# Altium footprint library Connector_PinHeader_2.54mm.PcbLib: 278 footprints (part 14 of 18) (continued)
## PinHeader_2x20_P2.54mm_Horizontal [mm] (continued)
  text "'.Designator'" at 6.15,-28.177 h1

## PinHeader_2x20_P2.54mm_Vertical [mm]
pads (40):
  rect 1.7x1.7 hole 1: 1(0,0)
  rrect100% 1.7x1.7 hole 1: 2(2.54,0) 3(0,-2.54) 4(2.54,-2.54) 5(0,-5.08) 6(2.54,-5.08) 7(0,-7.62) 8(2.54,-7.62) 9(0,-10.16) 10(2.54,-10.16) 11(0,-12.7) 12(2.54,-12.7) 13(0,-15.24) 14(2.54,-15.24) 15(0,-17.78) 16(2.54,-17.78) 17(0,-20.32) 18(2.54,-20.32) 19(0,-22.86) 20(2.54,-22.86) 21(0,-25.4) 22(2.54,-25.4) 23(0,-27.94) 24(2.54,-27.94) 25(0,-30.48) 26(2.54,-30.48) 27(0,-33.02) 28(2.54,-33.02) 29(0,-35.56) 30(2.54,-35.56) 31(0,-38.1) 32(2.54,-38.1) 33(0,-40.64) 34(2.54,-40.64) 35(0,-43.18) 36(2.54,-43.18) 37(0,-45.72) 38(2.54,-45.72) 39(0,-48.26) 40(2.54,-48.26)
F.SilkS:
  lines w0.254: -1.33,0 -1.33,1.33 0,1.33 ; -1.33,-49.59 -1.33,-1.27 1.27,-1.27 1.27,1.33 3.87,1.33 3.87,-49.59 -1.33,-49.59
F.CrtYd:
  lines w0.254: -1.8,-50.05 -1.8,1.8 4.35,1.8 4.35,-50.05 -1.8,-50.05
F.Fab:
  lines w0.254: -1.27,-49.53 -1.27,0 0,1.27 3.81,1.27 3.81,-49.53 -1.27,-49.53
  text "'.Designator'" at 2.11,-28.177 h1

## PinHeader_2x20_P2.54mm_Vertical_SMD [mm]
pads (40):
  rect 3.15x1 smd: 1(-2.525,24.13) 2(2.525,24.13) 3(-2.525,21.59) 4(2.525,21.59) 5(-2.525,19.05) 6(2.525,19.05) 7(-2.525,16.51) 8(2.525,16.51) 9(-2.525,13.97) 10(2.525,13.97) 11(-2.525,11.43) 12(2.525,11.43) 13(-2.525,8.89) 14(2.525,8.89) 15(-2.525,6.35) 16(2.525,6.35) 17(-2.525,3.81) 18(2.525,3.81) 19(-2.525,1.27) 20(2.525,1.27) 21(-2.525,-1.27) 22(2.525,-1.27) 23(-2.525,-3.81) 24(2.525,-3.81) 25(-2.525,-6.35) 26(2.525,-6.35) 27(-2.525,-8.89) 28(2.525,-8.89) 29(-2.525,-11.43) 30(2.525,-11.43) 31(-2.525,-13.97) 32(2.525,-13.97) 33(-2.525,-16.51) 34(2.525,-16.51) 35(-2.525,-19.05) 36(2.525,-19.05) 37(-2.525,-21.59) 38(2.525,-21.59) 39(-2.525,-24.13) 40(2.525,-24.13)
F.SilkS:
  lines w0.254: -4.04,24.89 -2.6,24.89 -2.6,25.46 2.6,25.46 2.6,24.89 ; -2.6,-24.89 -2.6,-25.46 2.6,-25.46 2.6,-24.89 ; -2.6,-23.37 -2.6,-22.35 ; -2.6,-20.83 -2.6,-19.81 ; -2.6,-18.29 -2.6,-17.27 ; -2.6,-15.75 -2.6,-14.73 ; -2.6,-13.21 -2.6,-12.19 ; -2.6,-10.67 -2.6,-9.65 ; -2.6,-8.13 -2.6,-7.11 ; -2.6,-5.59 -2.6,-4.57 ; -2.6,-3.05 -2.6,-2.03 ; -2.6,-0.51 -2.6,0.51 ; -2.6,2.03 -2.6,3.05 ; -2.6,4.57 -2.6,5.59 ; -2.6,7.11 -2.6,8.13 ; -2.6,9.65 -2.6,10.67 ; -2.6,12.19 -2.6,13.21 ; -2.6,14.73 -2.6,15.75 ; -2.6,17.27 -2.6,18.29 ; -2.6,19.81 -2.6,20.83 ; -2.6,22.35 -2.6,23.37 ; 2.6,-23.37 2.6,-22.35 ; 2.6,-20.83 2.6,-19.81 ; 2.6,-18.29 2.6,-17.27 ; 2.6,-15.75 2.6,-14.73 ; 2.6,-13.21 2.6,-12.19 ; 2.6,-10.67 2.6,-9.65 ; 2.6,-8.13 2.6,-7.11 ; 2.6,-5.59 2.6,-4.57 ; 2.6,-3.05 2.6,-2.03 ; 2.6,-0.51 2.6,0.51 ; 2.6,2.03 2.6,3.05 ; 2.6,4.57 2.6,5.59 ; 2.6,7.11 2.6,8.13 ; 2.6,9.65 2.6,10.67 ; 2.6,12.19 2.6,13.21 ; 2.6,14.73 2.6,15.75 ; 2.6,17.27 2.6,18.29 ; 2.6,19.81 2.6,20.83 ; 2.6,22.35 2.6,23.37
F.CrtYd:
  lines w0.254: -5.9,-25.9 -5.9,25.9 5.9,25.9 5.9,-25.9 -5.9,-25.9
F.Fab:
  lines w0.254: -2.54,-24.45 -3.6,-24.45 -3.6,-23.81 -2.54,-23.81 ; -2.54,-21.91 -3.6,-21.91 -3.6,-21.27 -2.54,-21.27 ; -2.54,-19.37 -3.6,-19.37 -3.6,-18.73 -2.54,-18.73 ; -2.54,-16.83 -3.6,-16.83 -3.6,-16.19 -2.54,-16.19 ; -2.54,-14.29 -3.6,-14.29 -3.6,-13.65 -2.54,-13.65 ; -2.54,-11.75 -3.6,-11.75 -3.6,-11.11 -2.54,-11.11 ; -2.54,-9.21 -3.6,-9.21 -3.6,-8.57 -2.54,-8.57 ; -2.54,-6.67 -3.6,-6.67 -3.6,-6.03 -2.54,-6.03 ; -2.54,-4.13 -3.6,-4.13 -3.6,-3.49 -2.54,-3.49 ; -2.54,-1.59 -3.6,-1.59 -3.6,-0.95 -2.54,-0.95 ; -2.54,0.95 -3.6,0.95 -3.6,1.59 -2.54,1.59 ; -2.54,3.49 -3.6,3.49 -3.6,4.13 -2.54,4.13 ; -2.54,6.03 -3.6,6.03 -3.6,6.67 -2.54,6.67 ; -2.54,8.57 -3.6,8.57 -3.6,9.21 -2.54,9.21 ; -2.54,11.11 -3.6,11.11 -3.6,11.75 -2.54,11.75 ; -2.54,13.65 -3.6,13.65 -3.6,14.29 -2.54,14.29 ; -2.54,16.19 -3.6,16.19 -3.6,16.83 -2.54,16.83 ; -2.54,18.73 -3.6,18.73 -3.6,19.37 -2.54,19.37 ; -2.54,21.27 -3.6,21.27 -3.6,21.91 -2.54,21.91 ; -2.54,23.81 -3.6,23.81 -3.6,24.45 -2.54,24.45 ; 2.54,-24.45 3.6,-24.45 3.6,-23.81 2.54,-23.81 ; 2.54,-21.91 3.6,-21.91 3.6,-21.27 2.54,-21.27 ; 2.54,-19.37 3.6,-19.37 3.6,-18.73 2.54,-18.73 ; 2.54,-16.83 3.6,-16.83 3.6,-16.19 2.54,-16.19 ; 2.54,-14.29 3.6,-14.29 3.6,-13.65 2.54,-13.65 ; 2.54,-11.75 3.6,-11.75 3.6,-11.11 2.54,-11.11 ; 2.54,-9.21 3.6,-9.21 3.6,-8.57 2.54,-8.57 ; 2.54,-6.67 3.6,-6.67 3.6,-6.03 2.54,-6.03 ; 2.54,-4.13 3.6,-4.13 3.6,-3.49 2.54,-3.49 ; 2.54,-1.59 3.6,-1.59 3.6,-0.95 2.54,-0.95 ; 2.54,0.95 3.6,0.95 3.6,1.59 2.54,1.59 ; 2.54,3.49 3.6,3.49 3.6,4.13 2.54,4.13 ; 2.54,6.03 3.6,6.03 3.6,6.67 2.54,6.67 ; 2.54,8.57 3.6,8.57 3.6,9.21 2.54,9.21 ; 2.54,11.11 3.6,11.11 3.6,11.75 2.54,11.75 ; 2.54,13.65 3.6,13.65 3.6,14.29 2.54,14.29 ; 2.54,16.19 3.6,16.19 3.6,16.83 2.54,16.83 ; 2.54,18.73 3.6,18.73 3.6,19.37 2.54,19.37 ; 2.54,21.27 3.6,21.27 3.6,21.91 2.54,21.91 ; 2.54,23.81 3.6,23.81 3.6,24.45 2.54,24.45 ; -2.54,24.45 -1.59,25.4 2.54,25.4 2.54,-25.4 -2.54,-25.4 -2.54,24.45
  text "'.Designator'" at 0.84,-4.047 h1

## PinHeader_2x21_P2.54mm_Horizontal [mm]
pads (42):
  rect 1.7x1.7 hole 1: 1(0,0)
  rrect100% 1.7x1.7 hole 1: 2(2.54,0) 3(0,-2.54) 4(2.54,-2.54) 5(0,-5.08) 6(2.54,-5.08) 7(0,-7.62) 8(2.54,-7.62) 9(0,-10.16) 10(2.54,-10.16) 11(0,-12.7) 12(2.54,-12.7) 13(0,-15.24) 14(2.54,-15.24) 15(0,-17.78) 16(2.54,-17.78) 17(0,-20.32) 18(2.54,-20.32) 19(0,-22.86) 20(2.54,-22.86) 21(0,-25.4) 22(2.54,-25.4) 23(0,-27.94) 24(2.54,-27.94) 25(0,-30.48) 26(2.54,-30.48) 27(0,-33.02) 28(2.54,-33.02) 29(0,-35.56) 30(2.54,-35.56) 31(0,-38.1) 32(2.54,-38.1) 33(0,-40.64) 34(2.54,-40.64) 35(0,-43.18) 36(2.54,-43.18) 37(0,-45.72) 38(2.54,-45.72) 39(0,-48.26) 40(2.54,-48.26) 41(0,-50.8) 42(2.54,-50.8)
F.SilkS:
  drawing of 179 lines, arcs and shapes, not listed
F.CrtYd:
  lines w0.254: -1.8,-52.6 -1.8,1.8 13.1,1.8 13.1,-52.6 -1.8,-52.6
F.Fab:
  lines w0.254: 4.04,-51.12 -0.32,-51.12 -0.32,-50.48 4.04,-50.48 ; 4.04,-48.58 -0.32,-48.58 -0.32,-47.94 4.04,-47.94 ; 4.04,-46.04 -0.32,-46.04 -0.32,-45.4 4.04,-45.4 ; 4.04,-43.5 -0.32,-43.5 -0.32,-42.86 4.04,-42.86 ; 4.04,-40.96 -0.32,-40.96 -0.32,-40.32 4.04,-40.32 ; 4.04,-38.42 -0.32,-38.42 -0.32,-37.78 4.04,-37.78 ; 4.04,-35.88 -0.32,-35.88 -0.32,-35.24 4.04,-35.24 ; 4.04,-33.34 -0.32,-33.34 -0.32,-32.7 4.04,-32.7 ; 4.04,-30.8 -0.32,-30.8 -0.32,-30.16 4.04,-30.16 ; 4.04,-28.26 -0.32,-28.26 -0.32,-27.62 4.04,-27.62 ; 4.04,-25.72 -0.32,-25.72 -0.32,-25.08 4.04,-25.08 ; 4.04,-23.18 -0.32,-23.18 -0.32,-22.54 4.04,-22.54 ; 4.04,-20.64 -0.32,-20.64 -0.32,-20 4.04,-20 ; 4.04,-18.1 -0.32,-18.1 -0.32,-17.46 4.04,-17.46 ; 4.04,-15.56 -0.32,-15.56 -0.32,-14.92 4.04,-14.92 ; 4.04,-13.02 -0.32,-13.02 -0.32,-12.38 4.04,-12.38 ; 4.04,-10.48 -0.32,-10.48 -0.32,-9.84 4.04,-9.84 ; 4.04,-7.94 -0.32,-7.94 -0.32,-7.3 4.04,-7.3 ; 4.04,-5.4 -0.32,-5.4 -0.32,-4.76 4.04,-4.76 ; 4.04,-2.86 -0.32,-2.86 -0.32,-2.22 4.04,-2.22 ; 4.04,-0.32 -0.32,-0.32 -0.32,0.32 4.04,0.32 ; 6.58,-51.12 12.58,-51.12 12.58,-50.48 6.58,-50.48 ; 6.58,-48.58 12.58,-48.58 12.58,-47.94 6.58,-47.94 ; 6.58,-46.04 12.58,-46.04 12.58,-45.4 6.58,-45.4 ; 6.58,-43.5 12.58,-43.5 12.58,-42.86 6.58,-42.86 ; 6.58,-40.96 12.58,-40.96 12.58,-40.32 6.58,-40.32 ; 6.58,-38.42 12.58,-38.42 12.58,-37.78 6.58,-37.78 ; 6.58,-35.88 12.58,-35.88 12.58,-35.24 6.58,-35.24 ; 6.58,-33.34 12.58,-33.34 12.58,-32.7 6.58,-32.7 ; 6.58,-30.8 12.58,-30.8 12.58,-30.16 6.58,-30.16 ; 6.58,-28.26 12.58,-28.26 12.58,-27.62 6.58,-27.62 ; 6.58,-25.72 12.58,-25.72 12.58,-25.08 6.58,-25.08 ; 6.58,-23.18 12.58,-23.18 12.58,-22.54 6.58,-22.54 ; 6.58,-20.64 12.58,-20.64 12.58,-20 6.58,-20 ; 6.58,-18.1 12.58,-18.1 12.58,-17.46 6.58,-17.46 ; 6.58,-15.56 12.58,-15.56 12.58,-14.92 6.58,-14.92 ; 6.58,-13.02 12.58,-13.02 12.58,-12.38 6.58,-12.38 ; 6.58,-10.48 12.58,-10.48 12.58,-9.84 6.58,-9.84 ; 6.58,-7.94 12.58,-7.94 12.58,-7.3 6.58,-7.3 ; 6.58,-5.4 12.58,-5.4 12.58,-4.76 6.58,-4.76 ; 6.58,-2.86 12.58,-2.86 12.58,-2.22 6.58,-2.22 ; 6.58,-0.32 12.58,-0.32 12.58,0.32 6.58,0.32 ; 4.04,-52.07 4.04,0.635 4.675,1.27 6.58,1.27 6.58,-52.07 4.04,-52.07
  text "'.Designator'" at 6.15,-29.447 h1

## PinHeader_2x21_P2.54mm_Vertical [mm]
pads (42):
  rect 1.7x1.7 hole 1: 1(0,0)
  rrect100% 1.7x1.7 hole 1: 2(2.54,0) 3(0,-2.54) 4(2.54,-2.54) 5(0,-5.08) 6(2.54,-5.08) 7(0,-7.62) 8(2.54,-7.62) 9(0,-10.16) 10(2.54,-10.16) 11(0,-12.7) 12(2.54,-12.7) 13(0,-15.24) 14(2.54,-15.24) 15(0,-17.78) 16(2.54,-17.78) 17(0,-20.32) 18(2.54,-20.32) 19(0,-22.86) 20(2.54,-22.86) 21(0,-25.4) 22(2.54,-25.4) 23(0,-27.94) 24(2.54,-27.94) 25(0,-30.48) 26(2.54,-30.48) 27(0,-33.02) 28(2.54,-33.02) 29(0,-35.56) 30(2.54,-35.56) 31(0,-38.1) 32(2.54,-38.1) 33(0,-40.64) 34(2.54,-40.64) 35(0,-43.18) 36(2.54,-43.18) 37(0,-45.72) 38(2.54,-45.72) 39(0,-48.26) 40(2.54,-48.26) 41(0,-50.8) 42(2.54,-50.8)
F.SilkS:
  lines w0.254: -1.33,0 -1.33,1.33 0,1.33 ; -1.33,-52.13 -1.33,-1.27 1.27,-1.27 1.27,1.33 3.87,1.33 3.87,-52.13 -1.33,-52.13
F.CrtYd:
  lines w0.254: -1.8,-52.6 -1.8,1.8 4.35,1.8 4.35,-52.6 -1.8,-52.6
F.Fab:
  lines w0.254: -1.27,-52.07 -1.27,0 0,1.27 3.81,1.27 3.81,-52.07 -1.27,-52.07
  text "'.Designator'" at 2.11,-29.447 h1

## PinHeader_2x21_P2.54mm_Vertical_SMD [mm]
pads (42):
  rect 3.15x1 smd: 1(-2.525,25.4) 2(2.525,25.4) 3(-2.525,22.86) 4(2.525,22.86) 5(-2.525,20.32) 6(2.525,20.32) 7(-2.525,17.78) 8(2.525,17.78) 9(-2.525,15.24) 10(2.525,15.24) 11(-2.525,12.7) 12(2.525,12.7) 13(-2.525,10.16) 14(2.525,10.16) 15(-2.525,7.62) 16(2.525,7.62) 17(-2.525,5.08) 18(2.525,5.08) 19(-2.525,2.54) 20(2.525,2.54) 21(-2.525,0) 22(2.525,0) 23(-2.525,-2.54) 24(2.525,-2.54) 25(-2.525,-5.08) 26(2.525,-5.08) 27(-2.525,-7.62) 28(2.525,-7.62) 29(-2.525,-10.16) 30(2.525,-10.16) 31(-2.525,-12.7) 32(2.525,-12.7) 33(-2.525,-15.24) 34(2.525,-15.24) 35(-2.525,-17.78) 36(2.525,-17.78) 37(-2.525,-20.32) 38(2.525,-20.32) 39(-2.525,-22.86) 40(2.525,-22.86) 41(-2.525,-25.4) 42(2.525,-25.4)
F.SilkS:
  lines w0.254: -4.04,26.16 -2.6,26.16 -2.6,26.73 2.6,26.73 2.6,26.16 ; -2.6,-26.16 -2.6,-26.73 2.6,-26.73 2.6,-26.16 ; -2.6,-24.64 -2.6,-23.62 ; -2.6,-22.1 -2.6,-21.08 ; -2.6,-19.56 -2.6,-18.54 ; -2.6,-17.02 -2.6,-16 ; -2.6,-14.48 -2.6,-13.46 ; -2.6,-11.94 -2.6,-10.92 ; -2.6,-9.4 -2.6,-8.38 ; -2.6,-6.86 -2.6,-5.84 ; -2.6,-4.32 -2.6,-3.3 ; -2.6,-1.78 -2.6,-0.76 ; -2.6,0.76 -2.6,1.78 ; -2.6,3.3 -2.6,4.32 ; -2.6,5.84 -2.6,6.86 ; -2.6,8.38 -2.6,9.4 ; -2.6,10.92 -2.6,11.94 ; -2.6,13.46 -2.6,14.48 ; -2.6,16 -2.6,17.02 ; -2.6,18.54 -2.6,19.56 ; -2.6,21.08 -2.6,22.1 ; -2.6,23.62 -2.6,24.64 ; 2.6,-24.64 2.6,-23.62 ; 2.6,-22.1 2.6,-21.08 ; 2.6,-19.56 2.6,-18.54 ; 2.6,-17.02 2.6,-16 ; 2.6,-14.48 2.6,-13.46 ; 2.6,-11.94 2.6,-10.92 ; 2.6,-9.4 2.6,-8.38 ; 2.6,-6.86 2.6,-5.84 ; 2.6,-4.32 2.6,-3.3 ; 2.6,-1.78 2.6,-0.76 ; 2.6,0.76 2.6,1.78 ; 2.6,3.3 2.6,4.32 ; 2.6,5.84 2.6,6.86 ; 2.6,8.38 2.6,9.4 ; 2.6,10.92 2.6,11.94 ; 2.6,13.46 2.6,14.48 ; 2.6,16 2.6,17.02 ; 2.6,18.54 2.6,19.56 ; 2.6,21.08 2.6,22.1 ; 2.6,23.62 2.6,24.64
F.CrtYd:
  lines w0.254: -5.9,-27.2 -5.9,27.2 5.9,27.2 5.9,-27.2 -5.9,-27.2
F.Fab:
  lines w0.254: -2.54,-25.72 -3.6,-25.72 -3.6,-25.08 -2.54,-25.08 ; -2.54,-23.18 -3.6,-23.18 -3.6,-22.54 -2.54,-22.54 ; -2.54,-20.64 -3.6,-20.64 -3.6,-20 -2.54,-20 ; -2.54,-18.1 -3.6,-18.1 -3.6,-17.46 -2.54,-17.46 ; -2.54,-15.56 -3.6,-15.56 -3.6,-14.92 -2.54,-14.92 ; -2.54,-13.02 -3.6,-13.02 -3.6,-12.38 -2.54,-12.38 ; -2.54,-10.48 -3.6,-10.48 -3.6,-9.84 -2.54,-9.84 ; -2.54,-7.94 -3.6,-7.94 -3.6,-7.3 -2.54,-7.3 ; -2.54,-5.4 -3.6,-5.4 -3.6,-4.76 -2.54,-4.76 ; -2.54,-2.86 -3.6,-2.86 -3.6,-2.22 -2.54,-2.22 ; -2.54,-0.32 -3.6,-0.32 -3.6,0.32 -2.54,0.32 ; -2.54,2.22 -3.6,2.22 -3.6,2.86 -2.54,2.86 ; -2.54,4.76 -3.6,4.76 -3.6,5.4 -2.54,5.4 ; -2.54,7.3 -3.6,7.3 -3.6,7.94 -2.54,7.94 ; -2.54,9.84 -3.6,9.84 -3.6,10.48 -2.54,10.48 ; -2.54,12.38 -3.6,12.38 -3.6,13.02 -2.54,13.02 ; -2.54,14.92 -3.6,14.92 -3.6,15.56 -2.54,15.56 ; -2.54,17.46 -3.6,17.46 -3.6,18.1 -2.54,18.1 ; -2.54,20 -3.6,20 -3.6,20.64 -2.54,20.64 ; -2.54,22.54 -3.6,22.54 -3.6,23.18 -2.54,23.18 ; -2.54,25.08 -3.6,25.08 -3.6,25.72 -2.54,25.72 ; 2.54,-25.72 3.6,-25.72 3.6,-25.08 2.54,-25.08 ; 2.54,-23.18 3.6,-23.18 3.6,-22.54 2.54,-22.54 ; 2.54,-20.64 3.6,-20.64 3.6,-20 2.54,-20 ; 2.54,-18.1 3.6,-18.1 3.6,-17.46 2.54,-17.46 ; 2.54,-15.56 3.6,-15.56 3.6,-14.92 2.54,-14.92 ; 2.54,-13.02 3.6,-13.02 3.6,-12.38 2.54,-12.38 ; 2.54,-10.48 3.6,-10.48 3.6,-9.84 2.54,-9.84 ; 2.54,-7.94 3.6,-7.94 3.6,-7.3 2.54,-7.3 ; 2.54,-5.4 3.6,-5.4 3.6,-4.76 2.54,-4.76 ; 2.54,-2.86 3.6,-2.86 3.6,-2.22 2.54,-2.22 ; 2.54,-0.32 3.6,-0.32 3.6,0.32 2.54,0.32 ; 2.54,2.22 3.6,2.22 3.6,2.86 2.54,2.86 ; 2.54,4.76 3.6,4.76 3.6,5.4 2.54,5.4 ; 2.54,7.3 3.6,7.3 3.6,7.94 2.54,7.94 ; 2.54,9.84 3.6,9.84 3.6,10.48 2.54,10.48 ; 2.54,12.38 3.6,12.38 3.6,13.02 2.54,13.02 ; 2.54,14.92 3.6,14.92 3.6,15.56 2.54,15.56 ; 2.54,17.46 3.6,17.46 3.6,18.1 2.54,18.1 ; 2.54,20 3.6,20 3.6,20.64 2.54,20.64 ; 2.54,22.54 3.6,22.54 3.6,23.18 2.54,23.18 ; 2.54,25.08 3.6,25.08 3.6,25.72 2.54,25.72 ; -2.54,25.72 -1.59,26.67 2.54,26.67 2.54,-26.67 -2.54,-26.67 -2.54,25.72
  text "'.Designator'" at 0.84,-4.047 h1

## PinHeader_2x22_P2.54mm_Horizontal [mm]
pads (44):
  rect 1.7x1.7 hole 1: 1(0,0)
  rrect100% 1.7x1.7 hole 1: 2(2.54,0) 3(0,-2.54) 4(2.54,-2.54) 5(0,-5.08) 6(2.54,-5.08) 7(0,-7.62) 8(2.54,-7.62) 9(0,-10.16) 10(2.54,-10.16) 11(0,-12.7) 12(2.54,-12.7) 13(0,-15.24) 14(2.54,-15.24) 15(0,-17.78) 16(2.54,-17.78) 17(0,-20.32) 18(2.54,-20.32) 19(0,-22.86) 20(2.54,-22.86) 21(0,-25.4) 22(2.54,-25.4) 23(0,-27.94) 24(2.54,-27.94) 25(0,-30.48) 26(2.54,-30.48) 27(0,-33.02) 28(2.54,-33.02) 29(0,-35.56) 30(2.54,-35.56) 31(0,-38.1) 32(2.54,-38.1) 33(0,-40.64) 34(2.54,-40.64) 35(0,-43.18) 36(2.54,-43.18) 37(0,-45.72) 38(2.54,-45.72) 39(0,-48.26) 40(2.54,-48.26) 41(0,-50.8) 42(2.54,-50.8) 43(0,-53.34) 44(2.54,-53.34)
F.SilkS:
  drawing of 187 lines, arcs and shapes, not listed
F.CrtYd:
  lines w0.254: -1.8,-55.15 -1.8,1.8 13.1,1.8 13.1,-55.15 -1.8,-55.15
F.Fab:
  lines w0.254: 4.04,-53.66 -0.32,-53.66 -0.32,-53.02 4.04,-53.02 ; 4.04,-51.12 -0.32,-51.12 -0.32,-50.48 4.04,-50.48 ; 4.04,-48.58 -0.32,-48.58 -0.32,-47.94 4.04,-47.94 ; 4.04,-46.04 -0.32,-46.04 -0.32,-45.4 4.04,-45.4 ; 4.04,-43.5 -0.32,-43.5 -0.32,-42.86 4.04,-42.86 ; 4.04,-40.96 -0.32,-40.96 -0.32,-40.32 4.04,-40.32 ; 4.04,-38.42 -0.32,-38.42 -0.32,-37.78 4.04,-37.78 ; 4.04,-35.88 -0.32,-35.88 -0.32,-35.24 4.04,-35.24 ; 4.04,-33.34 -0.32,-33.34 -0.32,-32.7 4.04,-32.7 ; 4.04,-30.8 -0.32,-30.8 -0.32,-30.16 4.04,-30.16 ; 4.04,-28.26 -0.32,-28.26 -0.32,-27.62 4.04,-27.62 ; 4.04,-25.72 -0.32,-25.72 -0.32,-25.08 4.04,-25.08 ; 4.04,-23.18 -0.32,-23.18 -0.32,-22.54 4.04,-22.54 ; 4.04,-20.64 -0.32,-20.64 -0.32,-20 4.04,-20 ; 4.04,-18.1 -0.32,-18.1 -0.32,-17.46 4.04,-17.46 ; 4.04,-15.56 -0.32,-15.56 -0.32,-14.92 4.04,-14.92 ; 4.04,-13.02 -0.32,-13.02 -0.32,-12.38 4.04,-12.38 ; 4.04,-10.48 -0.32,-10.48 -0.32,-9.84 4.04,-9.84 ; 4.04,-7.94 -0.32,-7.94 -0.32,-7.3 4.04,-7.3 ; 4.04,-5.4 -0.32,-5.4 -0.32,-4.76 4.04,-4.76 ; 4.04,-2.86 -0.32,-2.86 -0.32,-2.22 4.04,-2.22 ; 4.04,-0.32 -0.32,-0.32 -0.32,0.32 4.04,0.32 ; 6.58,-53.66 12.58,-53.66 12.58,-53.02 6.58,-53.02 ; 6.58,-51.12 12.58,-51.12 12.58,-50.48 6.58,-50.48 ; 6.58,-48.58 12.58,-48.58 12.58,-47.94 6.58,-47.94 ; 6.58,-46.04 12.58,-46.04 12.58,-45.4 6.58,-45.4 ; 6.58,-43.5 12.58,-43.5 12.58,-42.86 6.58,-42.86 ; 6.58,-40.96 12.58,-40.96 12.58,-40.32 6.58,-40.32 ; 6.58,-38.42 12.58,-38.42 12.58,-37.78 6.58,-37.78 ; 6.58,-35.88 12.58,-35.88 12.58,-35.24 6.58,-35.24 ; 6.58,-33.34 12.58,-33.34 12.58,-32.7 6.58,-32.7 ; 6.58,-30.8 12.58,-30.8 12.58,-30.16 6.58,-30.16 ; 6.58,-28.26 12.58,-28.26 12.58,-27.62 6.58,-27.62 ; 6.58,-25.72 12.58,-25.72 12.58,-25.08 6.58,-25.08 ; 6.58,-23.18 12.58,-23.18 12.58,-22.54 6.58,-22.54 ; 6.58,-20.64 12.58,-20.64 12.58,-20 6.58,-20 ; 6.58,-18.1 12.58,-18.1 12.58,-17.46 6.58,-17.46 ; 6.58,-15.56 12.58,-15.56 12.58,-14.92 6.58,-14.92 ; 6.58,-13.02 12.58,-13.02 12.58,-12.38 6.58,-12.38 ; 6.58,-10.48 12.58,-10.48 12.58,-9.84 6.58,-9.84 ; 6.58,-7.94 12.58,-7.94 12.58,-7.3 6.58,-7.3 ; 6.58,-5.4 12.58,-5.4 12.58,-4.76 6.58,-4.76 ; 6.58,-2.86 12.58,-2.86 12.58,-2.22 6.58,-2.22 ; 6.58,-0.32 12.58,-0.32 12.58,0.32 6.58,0.32 ; 4.04,-54.61 4.04,0.635 4.675,1.27 6.58,1.27 6.58,-54.61 4.04,-54.61
  text "'.Designator'" at 6.15,-30.717 h1

## PinHeader_2x22_P2.54mm_Vertical [mm]
pads (44):
  rect 1.7x1.7 hole 1: 1(0,0)
  rrect100% 1.7x1.7 hole 1: 2(2.54,0) 3(0,-2.54) 4(2.54,-2.54) 5(0,-5.08) 6(2.54,-5.08) 7(0,-7.62) 8(2.54,-7.62) 9(0,-10.16) 10(2.54,-10.16) 11(0,-12.7) 12(2.54,-12.7) 13(0,-15.24) 14(2.54,-15.24) 15(0,-17.78) 16(2.54,-17.78) 17(0,-20.32) 18(2.54,-20.32) 19(0,-22.86) 20(2.54,-22.86) 21(0,-25.4) 22(2.54,-25.4) 23(0,-27.94) 24(2.54,-27.94) 25(0,-30.48) 26(2.54,-30.48) 27(0,-33.02) 28(2.54,-33.02) 29(0,-35.56) 30(2.54,-35.56) 31(0,-38.1) 32(2.54,-38.1) 33(0,-40.64) 34(2.54,-40.64) 35(0,-43.18) 36(2.54,-43.18) 37(0,-45.72) 38(2.54,-45.72) 39(0,-48.26) 40(2.54,-48.26) 41(0,-50.8) 42(2.54,-50.8) 43(0,-53.34) 44(2.54,-53.34)
F.SilkS:
  lines w0.254: -1.33,0 -1.33,1.33 0,1.33 ; -1.33,-54.67 -1.33,-1.27 1.27,-1.27 1.27,1.33 3.87,1.33 3.87,-54.67 -1.33,-54.67
F.CrtYd:
  lines w0.254: -1.8,-55.15 -1.8,1.8 4.35,1.8 4.35,-55.15 -1.8,-55.15
F.Fab:
  lines w0.254: -1.27,-54.61 -1.27,0 0,1.27 3.81,1.27 3.81,-54.61 -1.27,-54.61
  text "'.Designator'" at 2.11,-30.717 h1

## PinHeader_2x22_P2.54mm_Vertical_SMD [mm]
pads (44):
  rect 3.15x1 smd: 1(-2.525,26.67) 2(2.525,26.67) 3(-2.525,24.13) 4(2.525,24.13) 5(-2.525,21.59) 6(2.525,21.59) 7(-2.525,19.05) 8(2.525,19.05) 9(-2.525,16.51) 10(2.525,16.51) 11(-2.525,13.97) 12(2.525,13.97) 13(-2.525,11.43) 14(2.525,11.43) 15(-2.525,8.89) 16(2.525,8.89) 17(-2.525,6.35) 18(2.525,6.35) 19(-2.525,3.81) 20(2.525,3.81) 21(-2.525,1.27) 22(2.525,1.27) 23(-2.525,-1.27) 24(2.525,-1.27) 25(-2.525,-3.81) 26(2.525,-3.81) 27(-2.525,-6.35) 28(2.525,-6.35) 29(-2.525,-8.89) 30(2.525,-8.89) 31(-2.525,-11.43) 32(2.525,-11.43) 33(-2.525,-13.97) 34(2.525,-13.97) 35(-2.525,-16.51) 36(2.525,-16.51) 37(-2.525,-19.05) 38(2.525,-19.05) 39(-2.525,-21.59) 40(2.525,-21.59) 41(-2.525,-24.13) 42(2.525,-24.13) 43(-2.525,-26.67) 44(2.525,-26.67)
F.SilkS:
  lines w0.254: -4.04,27.43 -2.6,27.43 -2.6,28 2.6,28 2.6,27.43 ; -2.6,-27.43 -2.6,-28 2.6,-28 2.6,-27.43 ; -2.6,-25.91 -2.6,-24.89 ; -2.6,-23.37 -2.6,-22.35 ; -2.6,-20.83 -2.6,-19.81 ; -2.6,-18.29 -2.6,-17.27 ; -2.6,-15.75 -2.6,-14.73 ; -2.6,-13.21 -2.6,-12.19 ; -2.6,-10.67 -2.6,-9.65 ; -2.6,-8.13 -2.6,-7.11 ; -2.6,-5.59 -2.6,-4.57 ; -2.6,-3.05 -2.6,-2.03 ; -2.6,-0.51 -2.6,0.51 ; -2.6,2.03 -2.6,3.05 ; -2.6,4.57 -2.6,5.59 ; -2.6,7.11 -2.6,8.13 ; -2.6,9.65 -2.6,10.67 ; -2.6,12.19 -2.6,13.21 ; -2.6,14.73 -2.6,15.75 ; -2.6,17.27 -2.6,18.29 ; -2.6,19.81 -2.6,20.83 ; -2.6,22.35 -2.6,23.37 ; -2.6,24.89 -2.6,25.91 ; 2.6,-25.91 2.6,-24.89 ; 2.6,-23.37 2.6,-22.35 ; 2.6,-20.83 2.6,-19.81 ; 2.6,-18.29 2.6,-17.27 ; 2.6,-15.75 2.6,-14.73 ; 2.6,-13.21 2.6,-12.19 ; 2.6,-10.67 2.6,-9.65 ; 2.6,-8.13 2.6,-7.11 ; 2.6,-5.59 2.6,-4.57 ; 2.6,-3.05 2.6,-2.03 ; 2.6,-0.51 2.6,0.51 ; 2.6,2.03 2.6,3.05 ; 2.6,4.57 2.6,5.59 ; 2.6,7.11 2.6,8.13 ; 2.6,9.65 2.6,10.67 ; 2.6,12.19 2.6,13.21 ; 2.6,14.73 2.6,15.75 ; 2.6,17.27 2.6,18.29 ; 2.6,19.81 2.6,20.83 ; 2.6,22.35 2.6,23.37 ; 2.6,24.89 2.6,25.91
F.CrtYd:
  lines w0.254: -5.9,-28.45 -5.9,28.45 5.9,28.45 5.9,-28.45 -5.9,-28.45
F.Fab:
  lines w0.254: -2.54,-26.99 -3.6,-26.99 -3.6,-26.35 -2.54,-26.35 ; -2.54,-24.45 -3.6,-24.45 -3.6,-23.81 -2.54,-23.81 ; -2.54,-21.91 -3.6,-21.91 -3.6,-21.27 -2.54,-21.27 ; -2.54,-19.37 -3.6,-19.37 -3.6,-18.73 -2.54,-18.73 ; -2.54,-16.83 -3.6,-16.83 -3.6,-16.19 -2.54,-16.19 ; -2.54,-14.29 -3.6,-14.29 -3.6,-13.65 -2.54,-13.65 ; -2.54,-11.75 -3.6,-11.75 -3.6,-11.11 -2.54,-11.11 ; -2.54,-9.21 -3.6,-9.21 -3.6,-8.57 -2.54,-8.57 ; -2.54,-6.67 -3.6,-6.67 -3.6,-6.03 -2.54,-6.03 ; -2.54,-4.13 -3.6,-4.13 -3.6,-3.49 -2.54,-3.49 ; -2.54,-1.59 -3.6,-1.59 -3.6,-0.95 -2.54,-0.95 ; -2.54,0.95 -3.6,0.95 -3.6,1.59 -2.54,1.59 ; -2.54,3.49 -3.6,3.49 -3.6,4.13 -2.54,4.13 ; -2.54,6.03 -3.6,6.03 -3.6,6.67 -2.54,6.67 ; -2.54,8.57 -3.6,8.57 -3.6,9.21 -2.54,9.21 ; -2.54,11.11 -3.6,11.11 -3.6,11.75 -2.54,11.75 ; -2.54,13.65 -3.6,13.65 -3.6,14.29 -2.54,14.29 ; -2.54,16.19 -3.6,16.19 -3.6,16.83 -2.54,16.83 ; -2.54,18.73 -3.6,18.73 -3.6,19.37 -2.54,19.37 ; -2.54,21.27 -3.6,21.27 -3.6,21.91 -2.54,21.91 ; -2.54,23.81 -3.6,23.81 -3.6,24.45 -2.54,24.45 ; -2.54,26.35 -3.6,26.35 -3.6,26.99 -2.54,26.99 ; 2.54,-26.99 3.6,-26.99 3.6,-26.35 2.54,-26.35 ; 2.54,-24.45 3.6,-24.45 3.6,-23.81 2.54,-23.81 ; 2.54,-21.91 3.6,-21.91 3.6,-21.27 2.54,-21.27 ; 2.54,-19.37 3.6,-19.37 3.6,-18.73 2.54,-18.73 ; 2.54,-16.83 3.6,-16.83 3.6,-16.19 2.54,-16.19 ; 2.54,-14.29 3.6,-14.29 3.6,-13.65 2.54,-13.65 ; 2.54,-11.75 3.6,-11.75 3.6,-11.11 2.54,-11.11 ; 2.54,-9.21 3.6,-9.21 3.6,-8.57 2.54,-8.57 ; 2.54,-6.67 3.6,-6.67 3.6,-6.03 2.54,-6.03 ; 2.54,-4.13 3.6,-4.13 3.6,-3.49 2.54,-3.49 ; 2.54,-1.59 3.6,-1.59 3.6,-0.95 2.54,-0.95 ; 2.54,0.95 3.6,0.95 3.6,1.59 2.54,1.59 ; 2.54,3.49 3.6,3.49 3.6,4.13 2.54,4.13 ; 2.54,6.03 3.6,6.03 3.6,6.67 2.54,6.67 ; 2.54,8.57 3.6,8.57 3.6,9.21 2.54,9.21 ; 2.54,11.11 3.6,11.11 3.6,11.75 2.54,11.75 ; 2.54,13.65 3.6,13.65 3.6,14.29 2.54,14.29 ; 2.54,16.19 3.6,16.19 3.6,16.83 2.54,16.83 ; 2.54,18.73 3.6,18.73 3.6,19.37 2.54,19.37 ; 2.54,21.27 3.6,21.27 3.6,21.91 2.54,21.91 ; 2.54,23.81 3.6,23.81 3.6,24.45 2.54,24.45 ; 2.54,26.35 3.6,26.35 3.6,26.99 2.54,26.99 ; -2.54,26.99 -1.59,27.94 2.54,27.94 2.54,-27.94 -2.54,-27.94 -2.54,26.99
  text "'.Designator'" at 0.84,-4.047 h1